# Altium footprint library CATS-Vega.PcbLib: 42 footprints (part 1 of 3)
Each footprint in its own frame and in the unit in brackets; x right, y up, seen from the top. Pads: shape width x height; smd on the part's side, far side on the other; paste and mask are expansions set on the pad; w line width, h text height; cw(c..) or ccw(c..) is an arc to the next point about the centre after c.
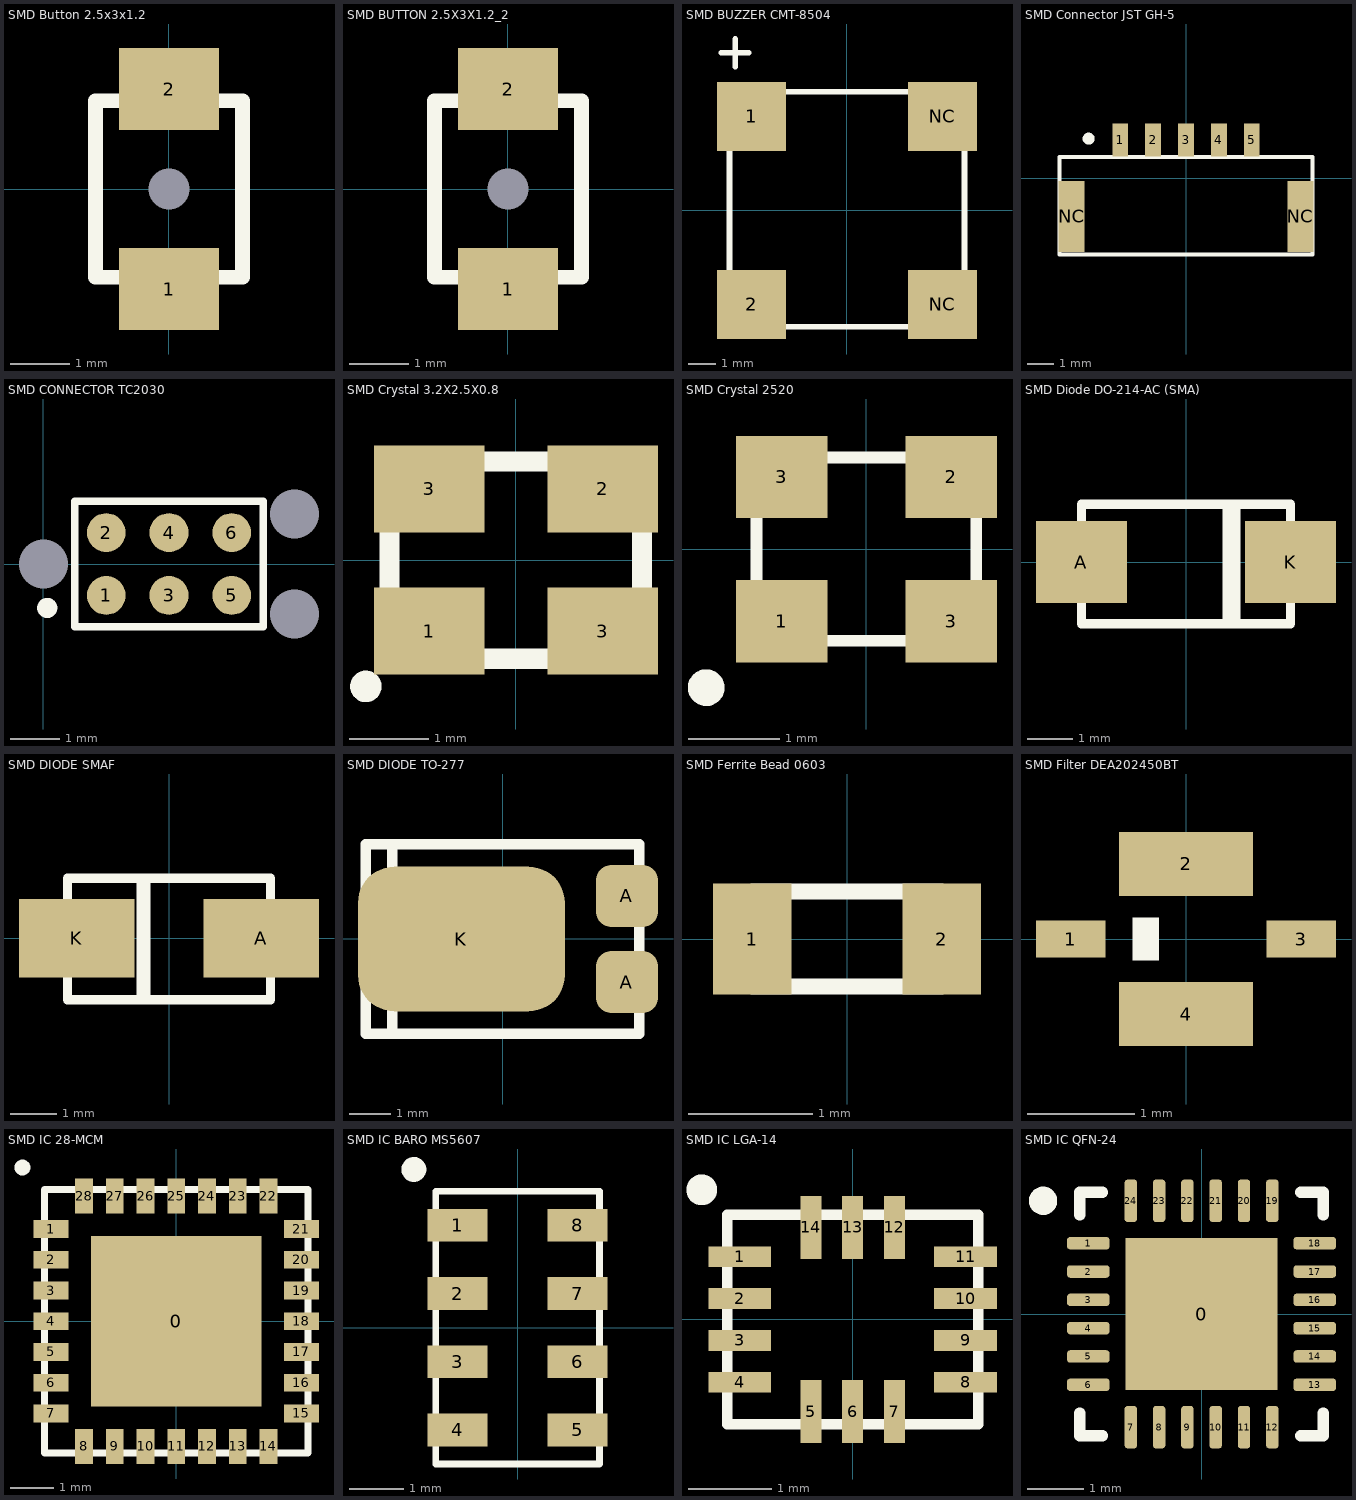
[diagram p0: the footprints below, top view; thin cyan lines are the x and y axes]

## SMD Button 2.5x3x1.2 [mm] "SMD_LED_RED"
height 8.65
pads (3):
  rect 1.7x1.4 smd: 1(0,-1.7) 2(0,1.7)
  round 0 hole 0.7: 6(0,0)
Top Overlay:
  lines w0.254: -1.25,-1.5 -1.25,0 -1.25,1.5 1.25,1.5 1.25,0 1.25,-1.5 -1.25,-1.5
3D body "B3U_1000P.step": height 1.6, standoff 0, extent -1.25,-2 1.25,2

## SMD BUTTON 2.5X3X1.2_2 [mm]
pads (3):
  rect 1.7x1.4 smd: 1(0,-1.7) 2(0,1.7)
  round 0 hole 0.7: 6(0,0)
Top Overlay:
  lines w0.254: -1.25,-1.5 1.25,-1.5 1.25,0 1.25,1.5 -1.25,1.5 -1.25,0 -1.25,-1.5
3D body "B3U_1000P.step": height 1.6, standoff 0, extent -1.25,-2 1.25,2

## SMD BUZZER CMT-8504 [mm]
pads (4):
  rect 2.5x2.5 smd: 1(-3.45,3.4) 2(-3.45,-3.4) NC(3.45,-3.4) NC(3.45,3.4)
Top Overlay:
  lines w0.2: -4.55,5.7 -3.55,5.7 ; -4.05,5.2 -4.05,6.2 ; -4.25,-4.2 -4.25,4.3 4.25,4.3 4.25,-4.2 -4.25,-4.2
3D body "CUI_DEVICES_CMT-8504-100-SMT-TR.step": height 4, standoff 0, extent -4.3,-4.278 4.228,4.25

## SMD Connector JST GH-5 [mm]
height 1.7
pads (7):
  rect 0.6x1.25 smd: 1(-2.5,1.45) 2(-1.25,1.45) 3(0,1.45) 4(1.25,1.45) 5(2.5,1.45)
  rect 1x2.7 smd: NC(-4.35,-1.45) NC(4.35,-1.45)
Top Overlay:
  circle w0.254: c-3.7,1.5 r0.1
  lines w0.152: -4.8,-2.9 4.8,-2.9 4.8,0.8 -4.8,0.8 -4.8,-2.9
3D body "SM05B-GHS-TB.STEP": height 4.35, standoff 0, extent -4.75,-2.85 4.75,2

## SMD CONNECTOR TC2030 [mm]
pads (9):
  round 0.787 smd paste-1: 1(1.27,-0.635) 2(1.27,0.635) 3(2.54,-0.635) 4(2.54,0.635) 5(3.81,-0.635) 6(3.81,0.635)
  round 0.1 hole 0.991: NC(0,0) NC(5.08,-1.016) NC(5.08,1.016)
Top Overlay:
  circle w0.254: c0.076,-0.889 r0.076
  lines w0.152: 0.635,-1.27 4.445,-1.27 4.445,1.27 0.635,1.27 0.635,-1.27

## SMD Crystal 3.2X2.5X0.8 [mm] "SMD_LED_RED"
height 8.65
pads (4):
  rect 1.4x1.1 smd: 1(-1.1,-0.9) 2(1.1,0.9) 3(-1.1,0.9) 3(1.1,-0.9)
Top Overlay:
  circle w0.2: c-1.9,-1.6 r0.1
  lines w0.254: -1.6,-1.25 1.6,-1.25 1.6,1.25 -1.6,1.25 -1.6,-1.25
3D body "User Library-Crystal TXC Corp 7M series.step": height 0.8, standoff 0, extent -1.65,-1.3 1.65,1.3

## SMD Crystal 2520 [mm]
pads (4):
  rect 1x0.9 smd: 1(-0.925,-0.787) 2(0.925,0.788) 3(-0.925,0.788) 3(0.925,-0.787)
Top Overlay:
  circle w0.2: c-1.75,-1.512 r0.1
  lines w0.127: -1.2,-1 -1.2,1 1.2,1 1.2,-1 -1.2,-1
3D body "2520 SMD Crystal Oscillator.STEP": height 0.7, standoff 0, extent -1.25,-1 1.25,1

## SMD Diode DO-214-AC (SMA) [mm] "SM LED; 2 Flat Leads"
height 1.3
pads (2):
  rect 2x1.8 smd: A(-2.3,0) K(2.3,0)
Top Overlay:
  lines w0.2: 0.9,-1.328 0.9,1.2 ; 1,-1.328 1,1.2 ; 1.1,-1.328 1.1,1.2 ; -2.3,-1.358 2.3,-1.358 2.3,1.27 -2.3,1.27 -2.3,-1.358
3D body "User Library-S1G-1.step": height 2.7, standoff 0, extent -2.8,-1.475 2.8,1.475

## SMD DIODE SMAF [mm]
pads (2):
  rect 2.5x1.7 smd: A(2,0) K(-2,0)
Top Overlay:
  lines w0.2: -0.6,-1.258 -0.6,1.27 ; -0.5,-1.258 -0.5,1.27 ; -2.2,-1.328 -2.2,1.3 2.2,1.3 2.2,-1.328 -2.2,-1.328
3D body "SMAF.STEP": height 1, standoff -0.01, extent -2.65,-1.266 2.65,1.266

## SMD DIODE TO-277 [mm]
pads (3):
  rrect50% 1.5x1.5 smd: A(3,-1.04) A(3,1.04)
  rrect50% 5x3.5 smd: K(-1,0)
Top Overlay:
  lines w0.254: -2.675,-2.286 -2.675,2.286 ; -3.31,-2.286 3.294,-2.286 3.294,-1.905 3.294,2.286 -3.31,2.286 -3.31,-1.651 -3.31,-2.286
3D body "TO-277-ST.stp": height 1.2, standoff 0, extent -3.325,-2.375 3.325,2.375

## SMD Ferrite Bead 0603 [mil]
height 66.93
pads (2):
  rect 25x35 smd: 1(-30,0) 2(30,0)
Top Overlay:
  lines w5: -30,-15 -30,15 30,15 30,-15 -30,-15
3D body "User Library-BLM18K.step": height 32.68, standoff 1.18, extent -31.5,-15.75 31.5,15.75

## SMD Filter DEA202450BT [mm]
pads (4):
  rect 0.65x0.35 smd: 1(-1.075,0) 3(1.075,0)
  rect 1.25x0.6 smd: 2(0,0.7) 4(0,-0.7)
Top Overlay:
  rectangle: -0.5,-0.2 -0.25,0.2
3D body: height 0.9, standoff 0, extent -1,-0.625 1,0.625

## SMD IC 28-MCM [mm]
height 1.7
pads (29):
  rect 3.875x3.875 smd: 0(0,0)
  rect 0.8x0.4 smd: 1(-2.85,2.1) 2(-2.85,1.4) 3(-2.85,0.7) 4(-2.85,0) 5(-2.85,-0.7) 6(-2.85,-1.4) 7(-2.85,-2.1) 15(2.85,-2.1) 16(2.85,-1.4) 17(2.85,-0.7) 18(2.85,0) 19(2.85,0.7) 20(2.85,1.4) 21(2.85,2.1)
  rect 0.4x0.8 smd: 8(-2.1,-2.85) 9(-1.4,-2.85) 10(-0.7,-2.85) 11(0,-2.85) 12(0.7,-2.85) 13(1.4,-2.85) 14(2.1,-2.85) 22(2.1,2.85) 23(1.4,2.85) 24(0.7,2.85) 25(0,2.85) 26(-0.7,2.85) 27(-1.4,2.85) 28(-2.1,2.85)
Top Overlay:
  circle w0.2: c-3.5,3.5 r0.08
  lines w0.152: -3,-3 3,-3 3,3 -3,3 -3,-3
3D body: height 0.85, standoff 0, extent -3,-3 3,3

## SMD IC BARO MS5607 [mm]
height 1.7
pads (8):
  rect 1.1x0.6 smd: 1(-1.1,1.875) 2(-1.1,0.625) 3(-1.1,-0.625) 4(-1.1,-1.875) 5(1.1,-1.875) 6(1.1,-0.625) 7(1.1,0.625) 8(1.1,1.875)
Top Overlay:
  circle w0.254: c-1.9,2.9 r0.1
  lines w0.127: -1.5,-2.5 -1.5,2.5 1.5,2.5 1.5,-2.5 -1.5,-2.5
3D body: height 0.95, standoff 0, extent -1.5,-2.5 1.5,2.5

## SMD IC LGA-14 [mm]
pads (14):
  rect 0.75x0.25 smd: 1(-1.35,0.75) 2(-1.35,0.25) 3(-1.35,-0.25) 4(-1.35,-0.75) 8(1.35,-0.75) 9(1.35,-0.25) 10(1.35,0.25) 11(1.35,0.75)
  rect 0.25x0.75 smd: 5(-0.5,-1.1) 6(0,-1.1) 7(0.5,-1.1) 12(0.5,1.1) 13(0,1.1) 14(-0.5,1.1)
Top Overlay:
  circle w0.254: c-1.803,1.549 r0.057
  lines w0.127: -1.5,-1.25 1.5,-1.25 1.5,1.25 -1.5,1.25 -1.5,-1.25
3D body: height 0.83, standoff 0, extent -1.5,-1.25 1.5,1.25
3D body: height 0.84, standoff 0.8, extent -1.198,0.551 -0.8,0.95

## SMD IC QFN-24 [mm] "QFN, 24-Leads, Body 4x4mm, Pitch 0.5mm, Thermal Pad 2.68x2.68mm, IPC Medium Density"
height 0.8
pads (25):
  rect 2.68x2.68 smd: 0(0,0)
  rrect50% 0.75x0.22 smd: 1(-2,1.25) 2(-2,0.75) 3(-2,0.25) 4(-2,-0.25) 5(-2,-0.75) 6(-2,-1.25) 13(2,-1.25) 14(2,-0.75) 15(2,-0.25) 16(2,0.25) 17(2,0.75) 18(2,1.25)
  rrect50% 0.22x0.75 smd: 7(-1.25,-2) 8(-0.75,-2) 9(-0.25,-2) 10(0.25,-2) 11(0.75,-2) 12(1.25,-2) 19(1.25,2) 20(0.75,2) 21(0.25,2) 22(-0.25,2) 23(-0.75,2) 24(-1.25,2)
Top Overlay:
  circle w0.25: c-2.8,2 r0.125
  lines w0.2: -2.15,-1.75 -2.15,-2.15 -1.75,-2.15 ; -2.15,1.75 -2.15,2.15 -1.75,2.15 ; 1.75,-2.15 2.15,-2.15 2.15,-1.75 ; 1.75,2.15 2.15,2.15 2.15,1.75
3D body "User Library-QFN 24 4x4.step": height 0.9, standoff 0, extent -2.002,-2.002 2.002,2.002